# Altium footprint library ERNI SMD.PcbLib: 26 footprints (part 1 of 2)
Each footprint in its own frame and in the unit in brackets; x right, y up, seen from the top. Pads: shape width x height; smd on the part's side, far side on the other; paste and mask are expansions set on the pad; w line width, h text height; cw(c..) or ccw(c..) is an arc to the next point about the centre after c.
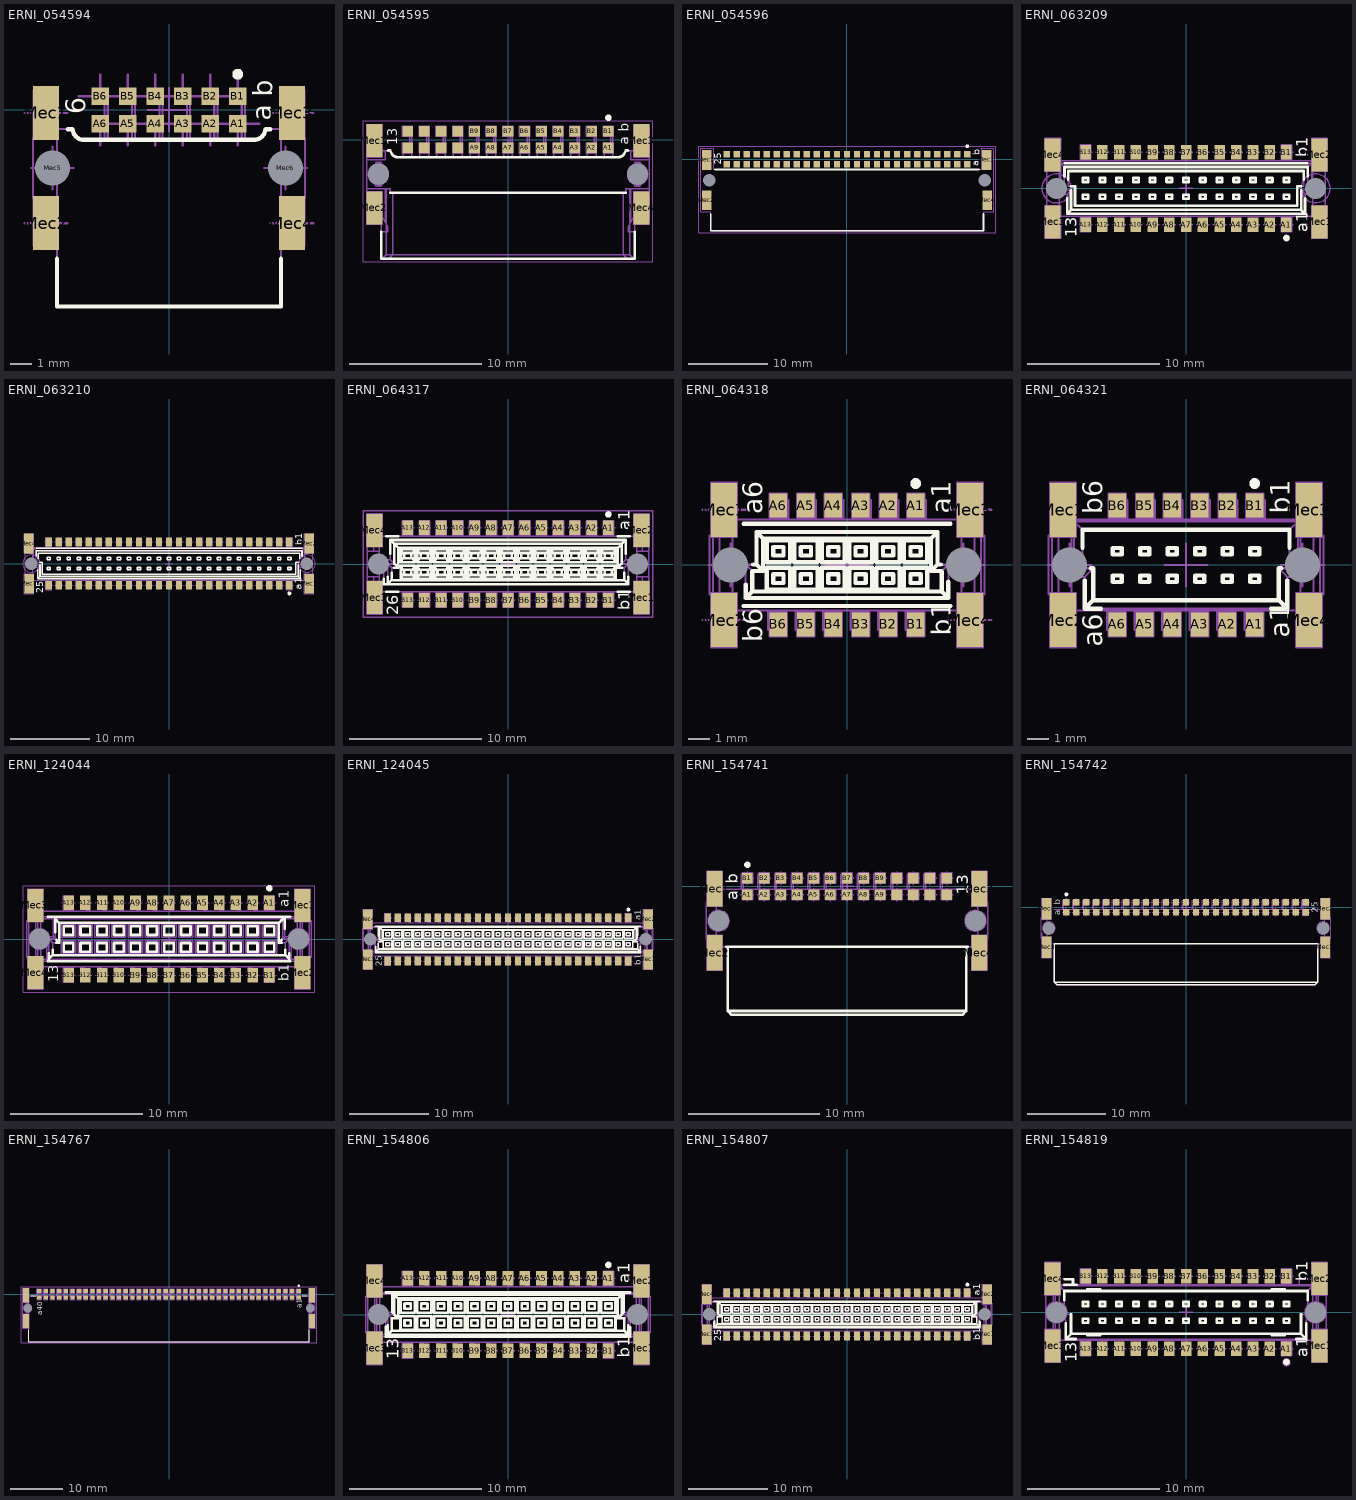
[diagram p0: the footprints below, top view; thin cyan lines are the x and y axes]

## ERNI_054594 [mm] "12 Contacts Pitch 1.27  SMC Right Angle Male Connector Type B"
height 4.2
pads (18):
  rect 0.8x0.8 smd: A1(3.175,-0.635) A2(1.905,-0.635) A3(0.635,-0.635) A4(-0.635,-0.635) A5(-1.905,-0.635) A6(-3.175,-0.635) B1(3.175,0.635) B2(1.905,0.635) B3(0.635,0.635) B4(-0.635,0.635) B5(-1.905,0.635) B6(-3.175,0.635)
  rect 1.2x2.5 smd: Mec1(-5.685,-0.135) Mec2(-5.685,-5.235) Mec3(5.685,-0.135) Mec4(5.685,-5.235)
  round 1 hole 1.6 unplated mask+0.3: Mec5(-5.385,-2.685) Mec6(5.385,-2.685)
Top Overlay:
  circle w0.25: c3.175,1.651 r0.125
  lines w0.2: -5.175,-6.885 -5.175,-9.085 5.175,-9.085 5.175,-6.885 ; -4.685,-0.885 -4.475,-0.885 -4.413,-1.055 ccw(c-3.942,-0.884) -3.941,-1.385 3.941,-1.385 ccw(c3.942,-0.884) 4.413,-1.054 4.475,-0.885 4.685,-0.885
  text "a" at 4.725,-0.5 h0.9
  text "b" at 4.78,0.6 h0.9
  text "6" at -3.875,-0.2 h0.9
Mechanical 8:
  lines w0.1: -6.685,-5.235 -5.685,-5.235 ; -6.685,-0.135 -5.685,-0.135 ; -6.385,-2.685 -5.385,-2.685 ; -5.685,-6.235 -5.685,-5.235 ; -5.685,-4.235 -5.685,-5.235 ; -5.685,-1.135 -5.685,-0.135 ; -5.685,0.865 -5.685,-0.135 ; -5.385,-3.685 -5.385,-2.685 ; -5.385,-1.685 -5.385,-2.685 ; -4.685,-5.235 -5.685,-5.235 ; -4.685,-0.135 -5.685,-0.135 ; -4.385,-2.685 -5.385,-2.685 ; -4.175,0.635 -3.175,0.635 -3.175,1.635 ; -3.175,-1.635 -3.175,-0.635 -2.175,-0.635 ; -2.905,0.635 -1.905,0.635 -1.905,1.635 ; -1.905,-1.635 -1.905,-0.635 -0.905,-0.635 ; -1.635,0.635 -0.635,0.635 -0.635,1.635 ; -1,0 0,0 ; -0.635,-1.635 -0.635,-0.635 0.365,-0.635 ; -0.365,0.635 0.635,0.635 0.635,1.635 ; 0,-1 0,0 ; 0,1 0,0 ; 0.635,-1.635 0.635,-0.635 1.635,-0.635 ; 0.905,0.635 1.905,0.635 1.905,1.635 ; 1,0 0,0 ; 1.905,-1.635 1.905,-0.635 2.905,-0.635 ; 2.175,0.635 3.175,0.635 3.175,1.635 ; 3.175,-1.635 3.175,-0.635 4.175,-0.635 ; 4.385,-2.685 5.385,-2.685 ; 4.685,-5.235 5.685,-5.235 ; 4.685,-0.135 5.685,-0.135 ; 5.385,-3.685 5.385,-2.685 ; 5.385,-1.685 5.385,-2.685 ; 5.685,-6.235 5.685,-5.235 ; 5.685,-4.235 5.685,-5.235 ; 5.685,-1.135 5.685,-0.135 ; 5.685,0.865 5.685,-0.135 ; 6.385,-2.685 5.385,-2.685 ; 6.685,-5.235 5.685,-5.235 ; 6.685,-0.135 5.685,-0.135
Mechanical 14:
  lines w0.1: -5.585,-4.135 -6.255,-4.135 -6.255,-6.285 -5.255,-6.285 -5.255,-5.785 -5.255,-5.485 ; -5.585,-4.085 -5.585,-5.485 -5.185,-5.485 -5.185,0.115 -5.255,0.115 ; -5.585,-1.285 -5.585,0.115 -5.255,0.115 ; -5.585,-1.235 -6.255,-1.235 -6.255,0.915 -5.255,0.915 -5.255,0.115 ; -5.185,-4.085 -6.285,-4.085 -6.285,-1.285 -5.185,-1.285 ; -3.345,-0.838 -3.345,-0.538 ; -3.345,0.433 -3.345,0.733 ; -3.245,-0.938 -2.985,-0.938 ; -3.245,-0.438 -2.985,-0.438 ; -3.245,0.333 -2.985,0.333 ; -3.245,0.833 -2.985,0.833 ; -2.985,-1.385 -2.985,0.833 ; -2.835,-1.385 -2.835,0.833 -2.985,0.833 ; -2.075,-0.838 -2.075,-0.538 ; -2.075,0.433 -2.075,0.733 ; -1.975,-0.938 -1.715,-0.938 ; -1.975,-0.438 -1.715,-0.438 ; -1.975,0.333 -1.715,0.333 ; -1.975,0.833 -1.715,0.833 ; -1.715,-1.385 -1.715,0.833 ; -1.565,-1.385 -1.565,0.833 -1.715,0.833 ; -0.805,-0.838 -0.805,-0.538 ; -0.805,0.433 -0.805,0.733 ; -0.705,-0.938 -0.445,-0.938 ; -0.705,-0.438 -0.445,-0.438 ; -0.705,0.333 -0.445,0.333 ; -0.705,0.833 -0.445,0.833 ; -0.445,-1.385 -0.445,0.833 ; -0.295,-1.385 -0.295,0.833 -0.445,0.833 ; 0.465,-0.838 0.465,-0.538 ; 0.465,0.433 0.465,0.733 ; 0.565,-0.938 0.825,-0.938 ; 0.565,-0.438 0.825,-0.438 ; 0.565,0.333 0.825,0.333 ; 0.565,0.833 0.825,0.833 ; 0.825,-1.385 0.825,0.833 ; 0.975,-1.385 0.975,0.833 0.825,0.833 ; 1.735,-0.838 1.735,-0.538 ; 1.735,0.433 1.735,0.733 ; 1.835,-0.938 2.095,-0.938 ; 1.835,-0.438 2.095,-0.438 ; 1.835,0.333 2.095,0.333 ; 1.835,0.833 2.095,0.833 ; 2.095,-1.385 2.095,0.833 ; 2.245,-1.385 2.245,0.833 2.095,0.833 ; 3.005,-0.838 3.005,-0.538 ; 3.005,0.433 3.005,0.733 ; 3.105,-0.938 3.365,-0.938 ; 3.105,-0.438 3.365,-0.438 ; 3.105,0.333 3.365,0.333 ; 3.105,0.833 3.365,0.833 ; 3.365,-1.385 3.365,0.833 ; 3.515,-1.385 3.515,0.833 3.365,0.833 ; 5.185,-4.085 6.285,-4.085 6.285,-1.285 5.185,-1.285 ; 5.255,-5.485 5.255,-5.785 5.255,-6.285 6.255,-6.285 6.255,-4.135 5.585,-4.135 ; 5.585,-4.085 5.585,-5.485 5.185,-5.485 5.185,0.115 5.255,0.115 ; 5.585,-1.285 5.585,0.115 5.255,0.115 ; 5.585,-1.235 6.255,-1.235 6.255,0.915 5.255,0.915 5.255,0.115 ; -5.175,-9.085 5.175,-9.085 5.175,-0.885 4.475,-0.885 4.413,-1.054 cw(c3.942,-0.884) 3.941,-1.385 -3.941,-1.385 cw(c-3.942,-0.884) -4.413,-1.055 -4.475,-0.885 -5.175,-0.885 -5.175,-9.085
  text "a6" at -4,-2.8 h1
  text "a1" at 2.7,-2.8 h1
  text "b" at 4.78,0.6 h0.9
  text "a" at 4.725,-0.5 h0.9
  text "6" at -3.875,-0.2 h0.9
3D body "ERNI_054594.stp": height 4.25, standoff -0.7, extent -6.285,-9.085 6.285,0.915

## ERNI_054595 [mil] "26 Contacts Pitch 1.27  SMC Right Angle Male Connector Type B"
height 165.35
pads (32):
  rect 31.5x31.5 smd: A1(300,-25) A2(250,-25) A3(200,-25) A4(150,-25) A5(100,-25) A6(50,-25) A7(0,-25) A8(-50,-25) A9(-100,-25) A10(-150,-25) A11(-200,-25) A12(-250,-25) A13(-300,-25) B1(300,25) B2(250,25) B3(200,25) B4(150,25) B5(100,25) B6(50,25) B7(0,25) B8(-50,25) B9(-100,25) B10(-150,25) B11(-200,25) B12(-250,25) B13(-300,25)
  rect 47.24x98.43 smd: Mec1(-398.82,-3.35) Mec2(-398.82,-204.13) Mec3(398.82,-3.35) Mec4(398.82,-204.13)
  round 39.37 hole 62.99 unplated mask+11.81: Mec5(-387.01,-103.74) Mec6(387.01,-103.74)
Top Overlay:
  circle w9.84: c300,65 r4.92
  lines w7.87: -378.78,-276.2 -378.78,-355.73 378.78,-355.73 378.78,-276.2 ; -358.27,-32.87 -351.22,-32.87 -348.77,-39.6 ccw(c-330.27,-32.87) -330.27,-52.55 330.27,-52.55 ccw(c330.27,-32.87) 348.77,-39.6 351.22,-32.87 358.27,-32.87 ; -351.61,-158.86 351.61,-158.86
  text "13" at -330.71,-16.73 h29.53
  text "b" at 360.24,22.64 h29.53
  text "a" at 360.24,-15.75 h29.53
Mechanical 8:
  drawing of 188 lines, arcs and shapes, not listed
Mechanical 14:
  drawing of 326 lines, arcs and shapes, not listed
  text "a13" at -330.71,-110.24 h39.37
  text "a1" at 290.55,-110.24 h39.37
  text "13" at -330.71,-16.73 h29.53
  text "a" at 360.24,-15.75 h29.53
  text "b" at 360.24,22.64 h29.53
Mechanical 15:
  lines w1.97: -432.33,-365.58 -432.33,55.71 432.33,55.71 432.33,-365.58 -432.33,-365.58
3D body "ERNI_054595.stp": height 167.32, standoff -29.53, extent -424.99,-355.7 425,38

## ERNI_054596 [mil] "50 Contacts Pitch 1.27  SMC Right Angle Male Connector Type B"
height 165.35
pads (56):
  rect 31.5x31.5 smd: A1(600,-25) A2(550,-25) A3(500,-25) A4(450,-25) A5(400,-25) A6(350,-25) A7(300,-25) A8(250,-25) A9(200,-25) A10(150,-25) A11(100,-25) A12(50,-25) A13(0,-25) A14(-50,-25) A15(-100,-25) A16(-150,-25) A17(-200,-25) A18(-250,-25) A19(-300,-25) A20(-350,-25) A21(-400,-25) A22(-450,-25) A23(-500,-25) A24(-550,-25) A25(-600,-25) B1(600,25) B2(550,25) B3(500,25) B4(450,25) B5(400,25) B6(350,25) B7(300,25) B8(250,25) B9(200,25) B10(150,25) B11(100,25) B12(50,25) B13(0,25) B14(-50,25) B15(-100,25) B16(-150,25) B17(-200,25) B18(-250,25) B19(-300,25) B20(-350,25) B21(-400,25) B22(-450,25) B23(-500,25) B24(-550,25) B25(-600,25)
  rect 47.24x98.43 smd: Mec1(-698.82,-3.35) Mec2(-698.43,-204.13) Mec3(698.43,-3.35) Mec4(699.21,-204.13)
  round 39.37 hole 62.99 unplated mask+11.81: Mec5(-687.01,-103.74) Mec6(687.01,-103.74)
Top Overlay:
  circle w9.84: c600,65 r4.92
  lines w7.87: -678.74,-271.65 -678.74,-355.71 681.26,-355.71 681.26,-271.65 ; -659.45,-50.71 659.45,-50.71
  text "25" at -627.95,-26.57 h35.43
  text "a" at 657.28,-33.46 h35.43
  text "b" at 662.2,20.67 h35.43
Mechanical 8:
  lines w1.97: 615.75,9.25 615.75,40.75
Mechanical 13:
  lines w3.94: -728.74,-260.71 -728.74,54.29 -663.74,54.29 -663.74,-50.71 671.26,-50.71 671.26,54.29 731.26,54.29 731.26,-260.71 681.26,-260.71 681.26,-355.71 -678.74,-355.71 -678.74,-260.71 -728.74,-260.71
Mechanical 14:
  lines w3.94: -728.74,-260.71 -728.74,54.29 -663.74,54.29 -663.74,-50.71 671.26,-50.71 671.26,54.29 731.26,54.29 731.26,-260.71 681.26,-260.71 681.26,-355.71 -678.74,-355.71 -678.74,-260.71 -728.74,-260.71
  text "b" at 662.2,20.67 h35.43
  text "a" at 657.28,-33.46 h35.43
  text "a1" at 590.55,-110.24 h39.37
  text "a25" at -629.92,-110.24 h39.37
Mechanical 15:
  lines w1.97: -739.17,-366.14 741.14,-366.14
  lines w3.94: -739.17,-366.14 -739.17,63.98 741.14,63.98 741.14,-366.14
3D body: height 165.35, standoff 0, extent -728.72,-355.69 731.24,54.27

## ERNI_063209 [mm] "26 Contacts Pitch 1.27  SMC Straight Male Connector Type Q"
height 8.2
pads (32):
  rect 0.8x1.1 smd: A1(7.623,-2.75) A2(6.353,-2.75) A3(5.083,-2.75) A4(3.813,-2.75) A5(2.543,-2.75) A6(1.273,-2.75) A7(0.003,-2.75) A8(-1.267,-2.75) A9(-2.537,-2.75) A10(-3.807,-2.75) A11(-5.077,-2.75) A12(-6.347,-2.75) A13(-7.617,-2.75) B1(7.623,2.75) B2(6.353,2.75) B3(5.083,2.75) B4(3.812,2.75) B5(2.542,2.75) B6(1.272,2.75) B7(0.002,2.75) B8(-1.268,2.75) B9(-2.538,2.75) B10(-3.808,2.75) B11(-5.078,2.75) B12(-6.348,2.75) B13(-7.618,2.75)
  rect 1.2x2.5 smd: Mec1(10.133,-2.55) Mec2(10.123,2.55) Mec3(-10.118,-2.55) Mec4(-10.138,2.55)
  round 1 hole 1.6 unplated mask+0.3: Mec5(9.833,0) Mec6(-9.828,0)
Top Overlay:
  circle w0.25: c7.622,-3.766 r0.125
  lines w0.2: -9.228,0.922 -9.228,1.625 9.233,1.625 9.233,0.922 ; -9.2,1.9 9.2,1.9 ; -9.028,-0.77 -9.028,-1.925 ; -8.928,0.65 -8.928,1.325 8.933,1.325 8.933,0.65 ; -8.728,-0.15 -8.728,-1.625 ; -8.728,0.15 -8.428,0.15 -8.428,-1.325 8.433,-1.325 8.433,0.15 8.733,0.15 ; 8.733,-0.15 8.733,-1.625 ; 9.033,-0.77 9.033,-1.925 ; -9.028,-1.925 9.033,-1.925 ; -9.028,-1.925 -8.728,-1.625 ; -8.728,-1.625 8.733,-1.625 ; 8.733,-1.625 9.033,-1.925 ; -7.83,-0.783 -7.41,-0.783 -7.41,-0.485 -7.83,-0.485 -7.83,-0.783 ; -7.83,0.487 -7.41,0.487 -7.41,0.785 -7.83,0.785 -7.83,0.487 ; -6.56,-0.783 -6.14,-0.783 -6.14,-0.485 -6.56,-0.485 -6.56,-0.783 ; -6.56,0.487 -6.14,0.487 -6.14,0.785 -6.56,0.785 -6.56,0.487 ; -5.29,-0.783 -4.87,-0.783 -4.87,-0.485 -5.29,-0.485 -5.29,-0.783 ; -5.29,0.487 -4.87,0.487 -4.87,0.785 -5.29,0.785 -5.29,0.487 ; -4.02,-0.783 -3.6,-0.783 -3.6,-0.485 -4.02,-0.485 -4.02,-0.783 ; -4.02,0.487 -3.6,0.487 -3.6,0.785 -4.02,0.785 -4.02,0.487 ; -2.75,-0.783 -2.33,-0.783 -2.33,-0.485 -2.75,-0.485 -2.75,-0.783 ; -2.75,0.487 -2.33,0.487 -2.33,0.785 -2.75,0.785 -2.75,0.487 ; -1.48,-0.783 -1.06,-0.783 -1.06,-0.485 -1.48,-0.485 -1.48,-0.783 ; -1.48,0.487 -1.06,0.487 -1.06,0.785 -1.48,0.785 -1.48,0.487 ; -0.21,-0.783 0.21,-0.783 0.21,-0.485 -0.21,-0.485 -0.21,-0.783 ; -0.21,0.487 0.21,0.487 0.21,0.785 -0.21,0.785 -0.21,0.487 ; 1.06,-0.783 1.48,-0.783 1.48,-0.485 1.06,-0.485 1.06,-0.783 ; 1.06,0.487 1.48,0.487 1.48,0.785 1.06,0.785 1.06,0.487 ; 2.33,-0.783 2.75,-0.783 2.75,-0.485 2.33,-0.485 2.33,-0.783 ; 2.33,0.487 2.75,0.487 2.75,0.785 2.33,0.785 2.33,0.487 ; 3.6,-0.783 4.02,-0.783 4.02,-0.485 3.6,-0.485 3.6,-0.783 ; 3.6,0.487 4.02,0.487 4.02,0.785 3.6,0.785 3.6,0.487 ; 4.87,-0.783 5.29,-0.783 5.29,-0.485 4.87,-0.485 4.87,-0.783 ; 4.87,0.487 5.29,0.487 5.29,0.785 4.87,0.785 4.87,0.487 ; 6.14,-0.783 6.56,-0.783 6.56,-0.485 6.14,-0.485 6.14,-0.783 ; 6.14,0.487 6.56,0.487 6.56,0.785 6.14,0.785 6.14,0.487 ; 7.41,-0.783 7.83,-0.783 7.83,-0.485 7.41,-0.485 7.41,-0.783 ; 7.41,0.487 7.83,0.487 7.83,0.785 7.41,0.785 7.41,0.487
  text "a1" at 9.232,-3.325 h0.9
  text "b1" at 9.232,2.375 h0.9
  text "13" at -8.303,-3.7 h0.9
Mechanical 8:
  drawing of 166 lines, arcs and shapes, not listed
Mechanical 14:
  drawing of 186 lines, arcs and shapes, not listed
  text "13" at -8.303,-3.7 h0.9
  text "a1" at 9.232,-3.325 h0.9
  text "b1" at 9.232,2.375 h0.9
3D body "ERNI_063209.stp": height 8.25, standoff -0.7, extent -10.727,-3.6 10.733,3.6

## ERNI_063210 [mm] "50 Contacts Pitch 1.27  SMC Straight Male Connector Type Q"
height 8.2
pads (56):
  rect 0.8x1.1 smd: A1(15.24,-2.75) A2(13.97,-2.75) A3(12.7,-2.75) A4(11.43,-2.75) A5(10.16,-2.75) A6(8.89,-2.75) A7(7.62,-2.75) A8(6.35,-2.75) A9(5.08,-2.75) A10(3.81,-2.75) A11(2.54,-2.75) A12(1.27,-2.75) A13(0,-2.75) A14(-1.27,-2.75) A15(-2.54,-2.75) A16(-3.81,-2.75) A17(-5.08,-2.75) A18(-6.35,-2.75) A19(-7.62,-2.75) A20(-8.89,-2.75) A21(-10.16,-2.75) A22(-11.43,-2.75) A23(-12.7,-2.75) A24(-13.97,-2.75) A25(-15.24,-2.75) B1(15.24,2.75) B2(13.97,2.75) B3(12.7,2.75) B4(11.43,2.75) B5(10.16,2.75) B6(8.89,2.75) B7(7.62,2.75) B8(6.35,2.75) B9(5.08,2.75) B10(3.81,2.75) B11(2.54,2.75) B12(1.27,2.75) B13(0,2.75) B14(-1.27,2.75) B15(-2.54,2.75) B16(-3.81,2.75) B17(-5.08,2.75) B18(-6.35,2.75) B19(-7.62,2.75) B20(-8.89,2.75) B21(-10.16,2.75) B22(-11.43,2.75) B23(-12.7,2.75) B24(-13.97,2.75) B25(-15.24,2.75)
  rect 1.2x2.5 smd: Mec1(17.75,-2.55) Mec2(17.74,2.55) Mec3(-17.74,-2.55) Mec4(-17.76,2.55)
  round 1 hole 1.6 unplated mask+0.3: Mec5(17.45,0) Mec6(-17.45,0)
Top Overlay:
  drawing of 221 lines, arcs and shapes, not listed
  text "25" at -15.95,-3.725 h0.9
  text "b1" at 16.85,2.325 h0.9
  text "a1" at 16.825,-3.325 h0.9
Mechanical 8:
  drawing of 262 lines, arcs and shapes, not listed
Mechanical 14:
  drawing of 280 lines, arcs and shapes, not listed
  text "25" at -15.95,-3.725 h0.9
  text "b1" at 16.85,2.325 h0.9
  text "a1" at 16.825,-3.325 h0.9
3D body "ERNI_063210.stp": height 8.25, standoff -0.7, extent -18.35,-3.6 18.35,3.6

## ERNI_064317 [mm] "26 Contacts Pitch 1.27  SMC Type B Straight Female Connector"
height 6.2
pads (32):
  rect 0.8x1.1 smd: A1(7.62,2.75) A2(6.35,2.75) A3(5.08,2.75) A4(3.81,2.75) A5(2.54,2.75) A6(1.27,2.75) A7(0,2.75) A8(-1.27,2.75) A9(-2.54,2.75) A10(-3.81,2.75) A11(-5.08,2.75) A12(-6.35,2.75) A13(-7.62,2.75) B1(7.62,-2.75) B2(6.35,-2.75) B3(5.08,-2.75) B4(3.81,-2.75) B5(2.54,-2.75) B6(1.27,-2.75) B7(0,-2.75) B8(-1.27,-2.75) B9(-2.54,-2.75) B10(-3.81,-2.75) B11(-5.08,-2.75) B12(-6.35,-2.75) B13(-7.62,-2.75)
  rect 1.2x2.5 smd: Mec1(10.133,-2.55) Mec2(10.123,2.55) Mec3(-10.118,-2.55) Mec4(-10.138,2.55)
  round 1 hole 1.6 unplated mask+0.3: Mec5(9.83,0) Mec6(-9.83,0)
Top Overlay:
  drawing of 347 lines, arcs and shapes, not listed
  text "b1" at 9.245,-3.5 h0.9
  text "a1" at 9.22,2.55 h0.9
  text "26" at -8.32,-3.875 h0.9
Mechanical 8:
  drawing of 252 lines, arcs and shapes, not listed
Mechanical 14:
  drawing of 397 lines, arcs and shapes, not listed
  text "b1" at 9.245,-3.5 h0.9
  text "a1" at 9.22,2.55 h0.9
  text "26" at -8.32,-3.875 h0.9
Mechanical 15:
  lines w0.1: -10.98,-4.05 -10.98,4.05 10.98,4.05 10.98,-4.05 -10.98,-4.05
3D body "ERNI_064317.stp": height 6.3, standoff -0.65, extent -10.695,-3.6 10.695,3.6

## ERNI_064318 [mm] "12 Contacts Pitch 1.27  SMC Vertical Female Connector Type B"
height 6.2
pads (18):
  rect 0.8x1.1 smd: A1(3.175,2.75) A2(1.905,2.75) A3(0.635,2.75) A4(-0.635,2.75) A5(-1.905,2.75) A6(-3.175,2.75) B1(3.175,-2.75) B2(1.905,-2.75) B3(0.635,-2.75) B4(-0.635,-2.75) B5(-1.905,-2.75) B6(-3.175,-2.75)
  rect 1.2x2.5 smd: Mec1(-5.685,2.55) Mec2(-5.685,-2.55) Mec3(5.685,2.55) Mec4(5.685,-2.55)
  round 1 hole 1.6 unplated mask+0.3: Mech5(-5.385,0) Mech6(5.385,0)
Top Overlay:
  circle w0.25: c3.175,3.766 r0.125
  lines w0.2: -4.785,-1.9 4.785,-1.9 ; -4.785,1.9 4.785,1.9 ; -4.685,-0.9 -4.685,-1.525 ; -4.385,-0.32 -4.385,-1.225 ; -4.372,-0.275 -3.885,-0.275 ; -4.335,0.025 -4.185,0.025 -4.185,1.525 ; -4.185,0.025 -3.885,-0.275 ; 4.185,0.025 3.885,-0.275 ; 4.335,0.025 4.185,0.025 4.185,1.525 ; 4.372,-0.275 3.885,-0.275 ; 4.385,-0.32 4.385,-1.225 ; 4.685,-0.783 4.685,-1.525 ; -4.685,-1.525 -4.385,-1.225 ; -4.685,-1.525 4.685,-1.525 ; -4.385,-1.225 4.385,-1.225 ; -4.185,1.525 4.185,1.525 ; -4.185,1.525 -3.885,1.225 ; -3.885,-0.275 -3.885,1.225 ; -3.885,1.225 3.885,1.225 ; -1.173,0.125 -0.097,0.125 ; -1.173,0.125 -1.173,1.135 ; -1.173,0.125 -0.097,0.125 ; -1.173,0.125 -1.173,1.135 ; -1.173,1.135 -0.097,1.135 ; -1.173,1.135 -0.097,1.135 ; -0.873,0.435 -0.397,0.435 ; -0.873,0.435 -0.873,0.835 ; -0.873,0.435 -0.397,0.435 ; -0.873,0.435 -0.873,0.835 ; -0.873,0.835 -0.397,0.835 ; -0.873,0.835 -0.397,0.835 ; -0.397,0.435 -0.397,0.835 ; -0.397,0.435 -0.397,0.835 ; -0.097,0.125 -0.097,1.135 ; -0.097,0.125 -0.097,1.135 ; 3.885,-0.275 3.885,1.225 ; 3.885,1.225 4.185,1.525 ; 4.385,-1.225 4.685,-1.525 ; -3.713,-1.145 -2.637,-1.145 -2.637,-0.135 -3.713,-0.135 -3.713,-1.145 ; -3.713,0.125 -2.637,0.125 -2.637,1.135 -3.713,1.135 -3.713,0.125 ; -3.413,-0.835 -2.937,-0.835 -2.937,-0.435 -3.413,-0.435 -3.413,-0.835 ; -3.413,0.435 -2.937,0.435 -2.937,0.835 -3.413,0.835 -3.413,0.435 ; -2.443,-1.145 -1.367,-1.145 -1.367,-0.135 -2.443,-0.135 -2.443,-1.145 ; -2.443,0.125 -1.367,0.125 -1.367,1.135 -2.443,1.135 -2.443,0.125 ; -2.143,-0.835 -1.667,-0.835 -1.667,-0.435 -2.143,-0.435 -2.143,-0.835 ; -2.143,0.435 -1.667,0.435 -1.667,0.835 -2.143,0.835 -2.143,0.435 ; -1.173,-1.145 -0.097,-1.145 -0.097,-0.135 -1.173,-0.135 -1.173,-1.145 ; -0.873,-0.835 -0.397,-0.835 -0.397,-0.435 -0.873,-0.435 -0.873,-0.835 ; 0.097,-1.145 1.173,-1.145 1.173,-0.135 0.097,-0.135 0.097,-1.145 ; 0.097,0.125 1.173,0.125 1.173,1.135 0.097,1.135 0.097,0.125 ; 0.397,-0.835 0.873,-0.835 0.873,-0.435 0.397,-0.435 0.397,-0.835 ; 0.397,0.435 0.873,0.435 0.873,0.835 0.397,0.835 0.397,0.435 ; 1.367,-1.145 2.443,-1.145 2.443,-0.135 1.367,-0.135 1.367,-1.145 ; 1.367,0.125 2.443,0.125 2.443,1.135 1.367,1.135 1.367,0.125 ; 1.667,-0.835 2.143,-0.835 2.143,-0.435 1.667,-0.435 1.667,-0.835 ; 1.667,0.435 2.143,0.435 2.143,0.835 1.667,0.835 1.667,0.435 ; 2.637,-1.145 3.713,-1.145 3.713,-0.135 2.637,-0.135 2.637,-1.145 ; 2.637,0.125 3.713,0.125 3.713,1.135 2.637,1.135 2.637,0.125 ; 2.937,-0.835 3.413,-0.835 3.413,-0.435 2.937,-0.435 2.937,-0.835 ; 2.937,0.435 3.413,0.435 3.413,0.835 2.937,0.835 2.937,0.435
  text "a6" at -3.925,2.35 h0.9
  text "b6" at -3.925,-3.575 h0.9
  text "b1" at 4.8,-3.275 h0.9
  text "a1" at 4.8,2.375 h0.9
Mechanical 8:
  lines w0.1: -6.685,-2.55 -5.685,-2.55 ; -6.685,2.55 -5.685,2.55 ; -6.385,0 -5.385,0 ; -5.685,-3.55 -5.685,-2.55 ; -5.685,-1.55 -5.685,-2.55 ; -5.685,1.55 -5.685,2.55 ; -5.685,3.55 -5.685,2.55 ; -5.385,-1 -5.385,0 ; -5.385,1 -5.385,0 ; -4.685,-2.55 -5.685,-2.55 ; -4.685,2.55 -5.685,2.55 ; -4.385,0 -5.385,0 ; -3.575,-3.3 -3.175,-2.75 ; -3.575,-2.2 -3.175,-2.75 ; -3.575,2.2 -3.175,2.75 ; -3.575,3.3 -3.175,2.75 ; -2.775,-3.3 -3.175,-2.75 ; -2.775,-2.2 -3.175,-2.75 ; -2.775,2.2 -3.175,2.75 ; -2.775,3.3 -3.175,2.75 ; -2.305,-3.3 -1.905,-2.75 ; -2.305,-2.2 -1.905,-2.75 ; -2.305,2.2 -1.905,2.75 ; -2.305,3.3 -1.905,2.75 ; -1.505,-3.3 -1.905,-2.75 ; -1.505,-2.2 -1.905,-2.75 ; -1.505,2.2 -1.905,2.75 ; -1.505,3.3 -1.905,2.75 ; -1.035,-3.3 -0.635,-2.75 ; -1.035,-2.2 -0.635,-2.75 ; -1.035,2.2 -0.635,2.75 ; -1.035,3.3 -0.635,2.75 ; -1,0 0,0 ; -0.235,-3.3 -0.635,-2.75 ; -0.235,-2.2 -0.635,-2.75 ; -0.235,2.2 -0.635,2.75 ; -0.235,3.3 -0.635,2.75 ; 0,-1 0,0 ; 0,1 0,0 ; 0.235,-3.3 0.635,-2.75 ; 0.235,-2.2 0.635,-2.75 ; 0.235,2.2 0.635,2.75 ; 0.235,3.3 0.635,2.75 ; 1,0 0,0 ; 1.035,-3.3 0.635,-2.75 ; 1.035,-2.2 0.635,-2.75 ; 1.035,2.2 0.635,2.75 ; 1.035,3.3 0.635,2.75 ; 1.505,-3.3 1.905,-2.75 ; 1.505,-2.2 1.905,-2.75 ; 1.505,2.2 1.905,2.75 ; 1.505,3.3 1.905,2.75 ; 2.305,-3.3 1.905,-2.75 ; 2.305,-2.2 1.905,-2.75 ; 2.305,2.2 1.905,2.75 ; 2.305,3.3 1.905,2.75 ; 2.775,-3.3 3.175,-2.75 ; 2.775,-2.2 3.175,-2.75 ; 2.775,2.2 3.175,2.75 ; 2.775,3.3 3.175,2.75 ; 3.575,-3.3 3.175,-2.75 ; 3.575,-2.2 3.175,-2.75 ; 3.575,2.2 3.175,2.75 ; 3.575,3.3 3.175,2.75 ; 4.385,0 5.385,0 ; 4.685,-2.55 5.685,-2.55 ; 4.685,2.55 5.685,2.55 ; 5.385,-1 5.385,0 ; 5.385,1 5.385,0 ; 5.685,-3.55 5.685,-2.55 ; 5.685,-1.55 5.685,-2.55 ; 5.685,1.55 5.685,2.55 ; 5.685,3.55 5.685,2.55 ; 6.385,0 5.385,0 ; 6.685,-2.55 5.685,-2.55 ; 6.685,2.55 5.685,2.55
Mechanical 14: